# Altium footprint library Vowstar_IC_General.PcbLib: 139 footprints (part 3 of 9)
Each footprint in its own frame and in the unit in brackets; x right, y up, seen from the top. Pads: shape width x height; smd on the part's side, far side on the other; paste and mask are expansions set on the pad; w line width, h text height; cw(c..) or ccw(c..) is an arc to the next point about the centre after c.
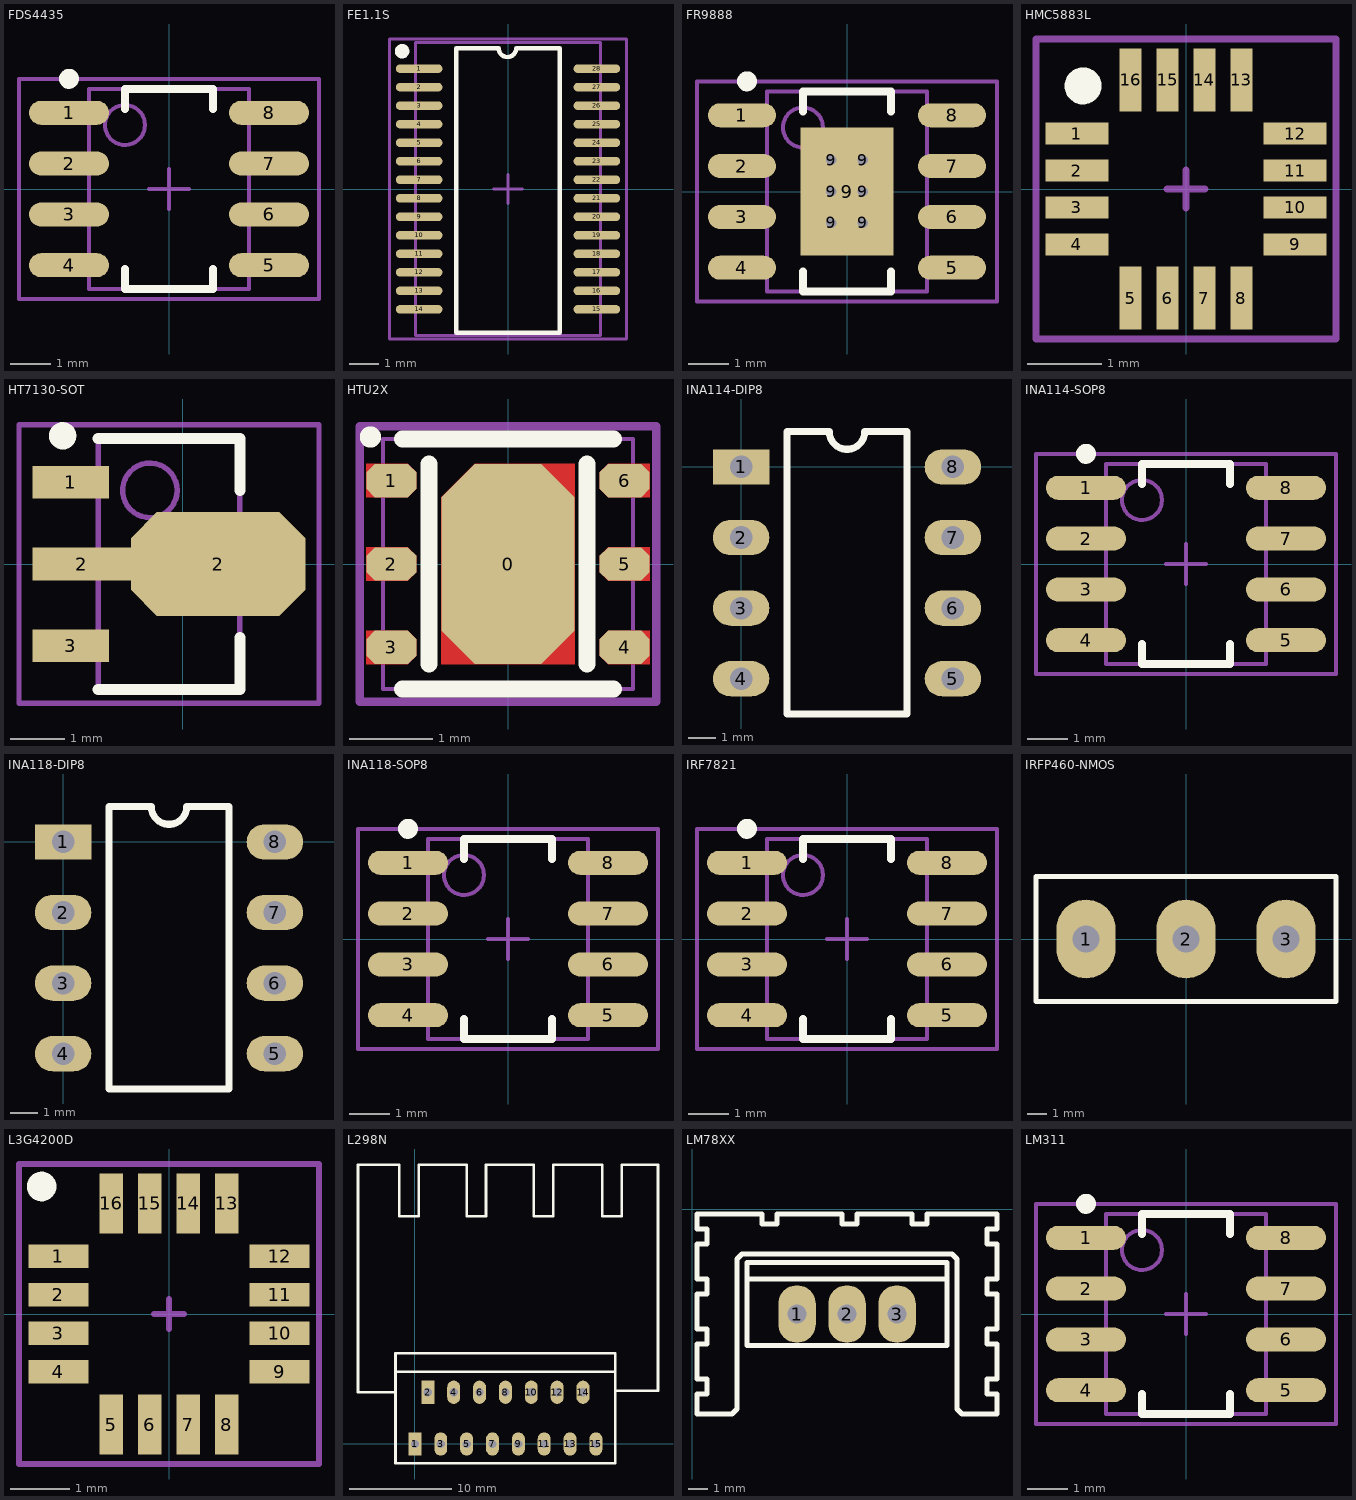
[diagram p2: the footprints below, top view; thin cyan lines are the x and y axes]

## FDS4435 [mm] "FDS4435 P-Channel Logic Level PowerTrench MOSFET"
height 1.75
pads (8):
  oval 2x0.6 smd: 1(-2.5,1.905) 2(-2.5,0.635) 3(-2.5,-0.635) 4(-2.5,-1.905) 5(2.5,-1.905) 6(2.5,-0.635) 7(2.5,0.635) 8(2.5,1.905)
Top Overlay:
  circle w0.25: c-2.5,2.755 r0.125
  lines w0.2: -1.1,-2 -1.1,-2.5 1.1,-2.5 1.1,-2 ; -1.1,2 -1.1,2.5 1.1,2.5 1.1,2
Mechanical 13:
  circle w0.1: c-1.1,1.6 r0.5
  lines w0.1: -2,-2.5 -2,2.5 2,2.5 2,-2.5 -2,-2.5
Mechanical 15:
  lines w0.1: -0.5,0 0.5,0 ; 0,-0.5 0,0.5 ; -3.75,-2.75 -3.75,2.75 3.75,2.75 3.75,-2.75 -3.75,-2.75
3D body "User Library-SOP-8.step": height 1.45, standoff 0, extent -2.921,-2.451 2.857,2.451

## FE1.1S [mm] "SSOP,28,间距0.64mm"
pads (28):
  oval 1.6x0.3 smd: 1(-3.048,4.127) 2(-3.048,3.492) 3(-3.048,2.857) 4(-3.048,2.222) 5(-3.048,1.587) 6(-3.048,0.953) 7(-3.048,0.318) 8(-3.048,-0.318) 9(-3.048,-0.953) 10(-3.048,-1.587) 11(-3.048,-2.222) 12(-3.048,-2.857) 13(-3.048,-3.492) 14(-3.048,-4.127) 15(3.048,-4.127) 16(3.048,-3.492) 17(3.048,-2.857) 18(3.048,-2.222) 19(3.048,-1.587) 20(3.048,-0.953) 21(3.048,-0.318) 22(3.048,0.318) 23(3.048,0.953) 24(3.048,1.587) 25(3.048,2.222) 26(3.048,2.857) 27(3.048,3.492) 28(3.048,4.127)
Top Overlay:
  circle w0.25: c-3.63,4.726 r0.125
  lines w0.152: -0.348,4.826 -1.778,4.826 -1.778,-4.928 1.778,-4.928 1.778,4.826 0.279,4.826 cw(c-0.021,4.826) -0.321,4.826
Mechanical 13:
  lines w0.1: -3.175,-5.016 -3.175,5.016 3.175,5.016 3.175,-5.016 -3.175,-5.016
Mechanical 15:
  lines w0.1: -0.5,0 0.5,0 ; 0,-0.5 0,0.5 ; -4.064,-5.143 -4.064,5.143 4.064,5.143 4.064,-5.143 -4.064,-5.143
3D body "User Library-SSOP28_LTC1923.STEP": height 1.75, standoff 0, extent -3.099,-4.978 3.089,5.004

## FR9888 [mil] "FR9888 SOP8 With Pad"
height 59.06
pads (15):
  oval 66.93x23.62 smd: 1(-103.43,75) 2(-103.43,25) 3(-103.43,-25) 4(-103.43,-75) 5(103.42,-75) 6(103.42,-25) 7(103.42,25) 8(103.42,75)
  round 20 / inner round 60 / far side round 20 hole 10: 9(-15.5,-31) 9(-15.5,0) 9(-15.5,31) 9(15.5,-31) 9(15.5,0) 9(15.5,31)
  rect 91.06x126.06 smd paste-60.04: 9(0,0)
Top Overlay:
  circle w9.84: c-98.43,108.46 r4.92
  lines w7.87: -43.31,-78.74 -43.31,-98.43 43.31,-98.43 43.31,-78.74 ; -43.31,78.74 -43.31,98.43 43.31,98.43 43.31,78.74
Top Paste:
  region: 19.44,57.09 19.44,40.5 25,34.94 39.37,34.94 39.37,57.09
  region: -11.56,57.09 -11.56,40.5 -6,34.94 6,34.94 11.56,40.5 11.56,57.09
  region: -39.37,57.09 -39.37,34.94 -25,34.94 -19.44,40.5 -19.44,57.09
  region: 19.44,21.5 19.44,9.5 25,3.94 39.37,3.94 39.37,27.06 25,27.06
  region: -11.56,21.5 -11.56,9.5 -6,3.94 6,3.94 11.56,9.5 11.56,21.5 6,27.06 -6,27.06
  region: -39.37,27.06 -39.37,3.94 -25,3.94 -19.44,9.5 -19.44,21.5 -25,27.06
  region: 19.44,-9.5 19.44,-21.5 25,-27.06 39.37,-27.06 39.37,-3.94 25,-3.94
  region: -11.56,-9.5 -11.56,-21.5 -6,-27.06 6,-27.06 11.56,-21.5 11.56,-9.5 6,-3.94 -6,-3.94
  region: -39.37,-3.94 -39.37,-27.06 -25,-27.06 -19.44,-21.5 -19.44,-9.5 -25,-3.94
  region: 19.44,-40.5 19.44,-57.09 39.37,-57.09 39.37,-34.94 25,-34.94
  region: -11.56,-40.5 -11.56,-57.09 11.56,-57.09 11.56,-40.5 6,-34.94 -6,-34.94
  region: -39.37,-34.94 -39.37,-57.09 -19.44,-57.09 -19.44,-40.5 -25,-34.94
Mechanical 13:
  circle w3.94: c-43.31,62.99 r19.68
  lines w3.94: -78.74,-98.43 78.74,-98.43 78.74,98.43 -78.74,98.43 -78.74,-98.43
Mechanical 15:
  lines w3.94: -19.68,0 19.68,0 ; 0,-19.68 0,19.68 ; -147.64,-108.27 147.64,-108.27 147.64,108.27 -147.64,108.27 -147.64,-108.27
3D body "User Library-SOP-8.step": height 57, standoff 0, extent -115,-96 112.49,97

## HMC5883L [mm] "HMC5883L 3-Axis Digital Compass IC"
height 0.9
pads (16):
  rect 0.85x0.3 smd: 1(-1.478,0.75) 2(-1.478,0.25) 3(-1.478,-0.25) 4(-1.478,-0.75) 9(1.478,-0.75) 10(1.478,-0.25) 11(1.478,0.25) 12(1.478,0.75)
  rect 0.3x0.85 smd: 5(-0.75,-1.478) 6(-0.25,-1.478) 7(0.25,-1.478) 8(0.75,-1.478) 13(0.75,1.478) 14(0.25,1.478) 15(-0.25,1.478) 16(-0.75,1.478)
Top Overlay:
  circle w0.25: c-1.395,1.397 r0.125
Mechanical 15:
  lines w0.1: -0.254,0 0.254,0 ; 0,-0.254 0,0.254 ; -2.032,-2.032 -2.032,2.032 2.032,2.032 2.032,-2.032 -2.032,-2.032
3D body "User Library-QFN-16.step": height 0.9, standoff 0, extent -1.499,-1.499 1.503,1.503

## HT7130-SOT [mm] "HT7130-SOT"
pads (4):
  rect 1.4x0.6 smd: 1(-2.054,1.5) 3(-2.054,-1.5)
  rect 1.8x0.6 smd: 2(-1.854,0)
  oct 3.2x1.9 smd: 2(0.646,0)
Top Overlay:
  circle w0.25: c-2.204,2.35 r0.125
  lines w0.2: -1.554,-2.3 1.046,-2.3 1.046,-1.35 ; -1.554,2.3 1.046,2.3 1.046,1.35
Mechanical 13:
  circle w0.1: c-0.604,1.35 r0.5
  lines w0.1: -1.554,-2.3 1.046,-2.3 1.046,2.3 -1.554,2.3 -1.554,-2.3
Mechanical 15:
  lines w0.1: -0.754,0 0.246,0 ; -0.254,-0.5 -0.254,0.5 ; -3.004,-2.55 2.496,-2.55 2.496,2.55 -3.004,2.55 -3.004,-2.55
3D body "User Library-SOT89.STEP": height 1.57, standoff -0.04, extent -2.54,-2.3 1.71,2.3

## HTU2X [mm] "HTU2X, The outer dotted line represents the  outer dime  nsion of the DFN package"
height 1.1
pads (7):
  oct 1.6x2.4 smd paste-1 mask-1: 0(0,0)
  oct 0.6x0.4 smd paste+0 mask+0.102: 1(-1.4,1) 2(-1.4,0) 3(-1.4,-1) 4(1.4,-1) 5(1.4,0) 6(1.4,1)
Top Layer:
  region: -1.7,1.2 -1.2,1.2 -1.1,1.1 -1.1,0.9 -1.2,0.8 -1.7,0.8
  region: -1.7,0.2 -1.2,0.2 -1.1,0.1 -1.1,-0.1 -1.2,-0.2 -1.7,-0.2
  region: -1.7,-0.8 -1.2,-0.8 -1.1,-0.9 -1.1,-1.1 -1.2,-1.2 -1.7,-1.2
  region: 1.7,-0.2 1.2,-0.2 1.1,-0.1 1.1,0.1 1.2,0.2 1.7,0.2
  region: 1.7,-1.2 1.2,-1.2 1.1,-1.1 1.1,-0.9 1.2,-0.8 1.7,-0.8
  region: 1.7,0.8 1.2,0.8 1.1,0.9 1.1,1.1 1.2,1.2 1.7,1.2
  region: -0.8,0.8 -0.4,1.2 0.8,1.2 0.8,-1.2 -0.8,-1.2
Top Overlay:
  circle w0.152: c-1.651,1.524 r0.051
  lines w0.2: -1.27,-1.5 1.27,-1.5 ; -1.27,1.5 1.27,1.5
  lines w0.203: -0.95,-1.2 -0.95,1.2 ; 0.95,-1.2 0.95,1.2
Top Paste:
  region: 0.8,-1.2 0.4,-1.2 0.4,-1 0.8,-1
  region: 0.2,-1.2 -0.2,-1.2 -0.2,-1 0.2,-1
  region: -0.4,-1.2 -0.8,-1.2 -0.8,-1 -0.4,-1
  region: 0.8,-0.8 0.4,-0.8 0.4,-0.4 0.8,-0.4
  region: 0.2,-0.8 -0.2,-0.8 -0.2,-0.4 0.2,-0.4
  region: -0.4,-0.8 -0.8,-0.8 -0.8,-0.4 -0.4,-0.4
  region: -0.4,-0.2 -0.8,-0.2 -0.8,0.2 -0.4,0.2
  region: 0.2,-0.2 -0.2,-0.2 -0.2,0.2 0.2,0.2
  region: 0.8,-0.2 0.4,-0.2 0.4,0.2 0.8,0.2
  region: 1.7,0.8 1.2,0.8 1.1,0.9 1.1,1.1 1.2,1.2 1.7,1.2
  region: 1.7,-0.2 1.2,-0.2 1.1,-0.1 1.1,0.1 1.2,0.2 1.7,0.2
  region: -1.7,0.2 -1.2,0.2 -1.1,0.1 -1.1,-0.1 -1.2,-0.2 -1.7,-0.2
  region: -1.7,-0.8 -1.2,-0.8 -1.1,-0.9 -1.1,-1.1 -1.2,-1.2 -1.7,-1.2
  region: 1.7,-1.2 1.2,-1.2 1.1,-1.1 1.1,-0.9 1.2,-0.8 1.7,-0.8
  region: -1.7,1.2 -1.2,1.2 -1.1,1.1 -1.1,0.9 -1.2,0.8 -1.7,0.8
  region: 0.8,0.4 0.4,0.4 0.4,0.8 0.8,0.8
  region: 0.2,0.4 -0.2,0.4 -0.2,0.8 0.2,0.8
  region: -0.4,0.4 -0.8,0.4 -0.8,0.8 -0.4,0.8
  region: 0.8,1 0.4,1 0.4,1.2 0.8,1.2
  region: 0.2,1 -0.2,1 -0.2,1.2 0.2,1.2
  region: -0.4,1 -0.6,1 -0.4,1.2
Top Solder:
  region: -1.8,1.3 -1.15,1.3 -1,1.15 -1,0.85 -1.15,0.7 -1.8,0.7
  region: -1.8,0.3 -1.15,0.3 -1,0.15 -1,-0.15 -1.15,-0.3 -1.8,-0.3
  region: -1.8,-0.7 -1.15,-0.7 -1,-0.85 -1,-1.15 -1.15,-1.3 -1.8,-1.3
  region: 1.8,-1.3 1.15,-1.3 1,-1.15 1,-0.85 1.15,-0.7 1.8,-0.7
  region: 1.8,-0.3 1.15,-0.3 1,-0.15 1,0.15 1.15,0.3 1.8,0.3
  region: 1.8,0.7 1.15,0.7 1,0.85 1,1.15 1.15,1.3 1.8,1.3
  region: -0.9,0.85 -0.45,1.3 0.9,1.3 0.9,-1.3 -0.9,-1.3
Mechanical 13:
  lines w0.051: -1.5,-1.5 1.5,-1.5 1.5,1.5 -1.5,1.5 -1.5,-1.5
Mechanical 15:
  lines w0.1: -0.254,0 0.254,0 ; 0,-0.254 0,0.254 ; -1.778,-1.651 -1.778,1.651 1.778,1.651 1.778,-1.651 -1.778,-1.651
3D body "User Library-Sensor_SHT21.step": height 1.1, standoff -0.02, extent -1.499,-1.5 1.521,1.5

## INA114-DIP8 [mil] "INA114-DIP8"
pads (8):
  rect 80x50 hole 32: 1(0,0)
  oval 80x50 hole 32: 2(0,-100) 3(0,-200) 4(0,-300) 5(300,-300) 6(300,-200) 7(300,-100) 8(300,0)
Top Overlay:
  lines w10: 65,-350 65,50 125,50 ccw(c150,50) 175,50 235,50 235,-350 65,-350
3D body "User Library-DIP-8-300-metric.step": height 177.17, standoff -137.8, extent -3,-362.6 302.54,62.6

## INA114-SOP8 [mm] "INA114-SOP8"
height 1.5
pads (8):
  oval 2x0.6 smd: 1(-2.5,1.905) 2(-2.5,0.635) 3(-2.5,-0.635) 4(-2.5,-1.905) 5(2.5,-1.905) 6(2.5,-0.635) 7(2.5,0.635) 8(2.5,1.905)
Top Overlay:
  circle w0.25: c-2.5,2.755 r0.125
  lines w0.2: -1.1,-2 -1.1,-2.5 1.1,-2.5 1.1,-2 ; -1.1,2 -1.1,2.5 1.1,2.5 1.1,2
Mechanical 13:
  circle w0.1: c-1.1,1.6 r0.5
  lines w0.1: -2,-2.5 2,-2.5 2,2.5 -2,2.5 -2,-2.5
Mechanical 15:
  lines w0.1: -0.5,0 0.5,0 ; 0,-0.5 0,0.5 ; -3.75,-2.75 3.75,-2.75 3.75,2.75 -3.75,2.75 -3.75,-2.75
3D body "User Library-SOP-8.step": height 1.45, standoff 0, extent -2.921,-2.451 2.857,2.451

## INA118-DIP8 [mil] "INA118-DIP8"
pads (8):
  rect 80x50 hole 32: 1(0,0)
  oval 80x50 hole 32: 2(0,-100) 3(0,-200) 4(0,-300) 5(300,-300) 6(300,-200) 7(300,-100) 8(300,0)
Top Overlay:
  lines w10: 65,-350 65,50 125,50 ccw(c150,50) 175,50 235,50 235,-350 65,-350
3D body "User Library-DIP-8-300-metric.step": height 177.17, standoff -137.8, extent -3,-362.6 302.54,62.6

## INA118-SOP8 [mm] "INA118-SOP8"
height 1.5
pads (8):
  oval 2x0.6 smd: 1(-2.5,1.905) 2(-2.5,0.635) 3(-2.5,-0.635) 4(-2.5,-1.905) 5(2.5,-1.905) 6(2.5,-0.635) 7(2.5,0.635) 8(2.5,1.905)
Top Overlay:
  circle w0.25: c-2.5,2.755 r0.125
  lines w0.2: -1.1,-2 -1.1,-2.5 1.1,-2.5 1.1,-2 ; -1.1,2 -1.1,2.5 1.1,2.5 1.1,2
Mechanical 13:
  circle w0.1: c-1.1,1.6 r0.5
  lines w0.1: -2,-2.5 2,-2.5 2,2.5 -2,2.5 -2,-2.5
Mechanical 15:
  lines w0.1: -0.5,0 0.5,0 ; 0,-0.5 0,0.5 ; -3.75,-2.75 3.75,-2.75 3.75,2.75 -3.75,2.75 -3.75,-2.75
3D body "User Library-SOP-8.step": height 1.45, standoff 0, extent -2.921,-2.451 2.857,2.451

## IRF7821 [mm] "IRF7821 N-Channel Power MOSFET"
height 1.75
pads (8):
  oval 2x0.6 smd: 1(-2.5,1.905) 2(-2.5,0.635) 3(-2.5,-0.635) 4(-2.5,-1.905) 5(2.5,-1.905) 6(2.5,-0.635) 7(2.5,0.635) 8(2.5,1.905)
Top Overlay:
  circle w0.25: c-2.5,2.755 r0.125
  lines w0.2: -1.1,-2 -1.1,-2.5 1.1,-2.5 1.1,-2 ; -1.1,2 -1.1,2.5 1.1,2.5 1.1,2
Mechanical 13:
  circle w0.1: c-1.1,1.6 r0.5
  lines w0.1: -2,-2.5 2,-2.5 2,2.5 -2,2.5 -2,-2.5
Mechanical 15:
  lines w0.1: -0.5,0 0.5,0 ; 0,-0.5 0,0.5 ; -3.75,-2.75 3.75,-2.75 3.75,2.75 -3.75,2.75 -3.75,-2.75
3D body "User Library-SOP-8.step": height 1.45, standoff 0, extent -2.921,-2.451 2.857,2.451

## IRFP460-NMOS [mm] "IRFP460-NMOS"
height 20
pads (3):
  oval 3x4 hole 1.35: 1(-5.08,0) 2(0,0) 3(5.08,0)
Top Overlay:
  lines w0.254: -7.62,-3.175 -7.62,3.175 7.62,3.175 7.62,-3.175 -7.62,-3.175
3D body "User Library-TO-247H Bent Lead.step": height 5.3, standoff -6.6, extent -7.75,-25.019 7.75,0.381

## L3G4200D [mm] "L3G4200D MEMS motion sensor:  ultra-stable three-axis digital output gyroscope"
height 1.1
pads (16):
  rect 1.02x0.4 smd: 1(-1.873,0.975) 2(-1.873,0.325) 3(-1.873,-0.325) 4(-1.873,-0.975) 9(1.873,-0.975) 10(1.873,-0.325) 11(1.873,0.325) 12(1.873,0.975)
  rect 0.4x1.02 smd: 5(-0.975,-1.873) 6(-0.325,-1.873) 7(0.325,-1.873) 8(0.975,-1.873) 13(0.975,1.873) 14(0.325,1.873) 15(-0.325,1.873) 16(-0.975,1.873)
Top Overlay:
  circle w0.25: c-2.157,2.159 r0.125
Mechanical 15:
  lines w0.1: -0.254,0 0.254,0 ; 0,-0.254 0,0.254 ; -2.54,-2.54 2.54,-2.54 2.54,2.54 -2.54,2.54 -2.54,-2.54
3D body "User Library-L3G4200D-1.step": height 1.11, standoff -0.01, extent -2.007,-2 1.993,2

## L298N [mil] "L298N"
pads (15):
  rect 50x90 hole 32: 1(0,0) 2(50,200)
  oval 50x90 hole 32: 3(100,0) 4(150,200) 5(200,0) 6(250,200) 7(300,0) 8(350,200) 9(400,0) 10(450,200) 11(500,0) 12(550,200) 13(600,0) 14(650,200) 15(700,0)
Top Overlay:
  lines w10: -75,200 -220,200 -220,1080 -60,1080 -60,880 15,880 15,1080 200,1080 200,880 275,880 275,1080 460,1080 460,880 535,880 535,1080 720,1080 ; -75,280 775,280 ; 725,1080 725,880 800,880 800,1080 940,1080 ; 775,195 775,205 940,205 940,1080 ; 935,1080 940,1080 ; -75,-75 -75,250 -75,350 775,350 775,-75 -75,-75

## LM78XX [mil] "LM78XX"
height 650
pads (3):
  oval 75x115 hole 37.4: 1(210,-210) 2(310,-210) 3(410,-210)
Top Overlay:
  lines w10: 110,-140 510,-140 ; 10,-410 80,-410 90,-400 90,-100 100,-90 520,-90 530,-100 530,-400 540,-410 560,-410 610,-410 610,-370 590,-370 590,-340 610,-340 610,-270 590,-270 590,-240 610,-240 610,-170 590,-170 590,-140 610,-140 610,-70 590,-70 590,-40 610,-40 610,-10 470,-10 470,-30 440,-30 440,-10 330,-10 330,-30 300,-30 300,-10 170,-10 170,-30 140,-30 140,-10 10,-10 10,-40 30,-40 30,-70 10,-70 10,-140 30,-140 30,-170 10,-170 10,-240 30,-240 30,-270 10,-270 10,-340 30,-340 30,-370 10,-370 10,-410 ; 110,-273 510,-273 510,-107 110,-107 110,-273
3D body "User Library-L7805.step": height 856.3, standoff -278.15, extent 110,-268 510,-102.84

## LM311 [mm] "LM311"
pads (8):
  oval 2x0.6 smd: 1(-2.5,1.905) 2(-2.5,0.635) 3(-2.5,-0.635) 4(-2.5,-1.905) 5(2.5,-1.905) 6(2.5,-0.635) 7(2.5,0.635) 8(2.5,1.905)
Top Overlay:
  circle w0.25: c-2.5,2.755 r0.125
  lines w0.2: -1.1,-2 -1.1,-2.5 1.1,-2.5 1.1,-2 ; -1.1,2 -1.1,2.5 1.1,2.5 1.1,2
Mechanical 13:
  circle w0.1: c-1.1,1.6 r0.5
  lines w0.1: -2,-2.5 2,-2.5 2,2.5 -2,2.5 -2,-2.5
Mechanical 15:
  lines w0.1: -0.5,0 0.5,0 ; 0,-0.5 0,0.5 ; -3.75,-2.75 3.75,-2.75 3.75,2.75 -3.75,2.75 -3.75,-2.75
3D body "User Library-SOP-8.step": height 1.45, standoff 0, extent -2.921,-2.451 2.857,2.451